# Altium footprint library Lapwing.PcbLib: 81 footprints (part 6 of 6)
Each footprint in its own frame and in the unit in brackets; x right, y up, seen from the top. Pads: shape width x height; smd on the part's side, far side on the other; paste and mask are expansions set on the pad; w line width, h text height; cw(c..) or ccw(c..) is an arc to the next point about the centre after c.
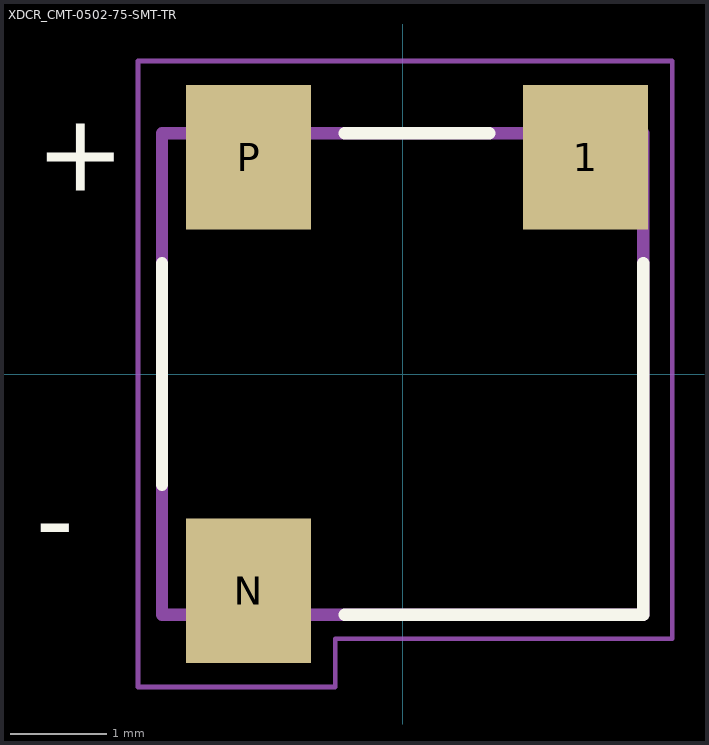
[diagram p5: the footprint, top view; thin cyan lines are the x and y axes]

## XDCR_CMT-0502-75-SMT-TR [mm]
pads (3):
  rect 1.3x1.5 smd: 1(1.9,2.25) N(-1.6,-2.25) P(-1.6,2.25)
Top Overlay:
  lines w0.127: -2.5,-1.15 -2.5,1.15 ; -0.6,-2.5 2.5,-2.5 2.5,1.15 ; -0.6,2.5 0.9,2.5
  text "-" at -3.81,-1.905 h0.81
  text "+" at -3.81,1.905 h0.81
Mechanical 13:
  lines w0.127: -2.5,-2.5 -2.5,2.5 2.5,2.5 2.5,-2.5 -2.5,-2.5
  text "+" at -3.81,1.905 h0.81
  text "-" at -3.81,-1.905 h0.81
Mechanical 15:
  lines w0.05: -2.75,-3.25 -2.75,3.25 2.8,3.25 2.8,-2.75 -0.7,-2.75 -0.7,-3.25 -2.75,-3.25
3D body "CUI_DEVICES_CMT-0502-75-SMT-TR.step": height 2, standoff 0, extent -2.5,-2.702 2.5,2.702